# Altium footprint library LDCN Components.PcbLib: 426 footprints (part 22 of 27)
Each footprint in its own frame and in the unit in brackets; x right, y up, seen from the top. Pads: shape width x height; smd on the part's side, far side on the other; paste and mask are expansions set on the pad; w line width, h text height; cw(c..) or ccw(c..) is an arc to the next point about the centre after c.
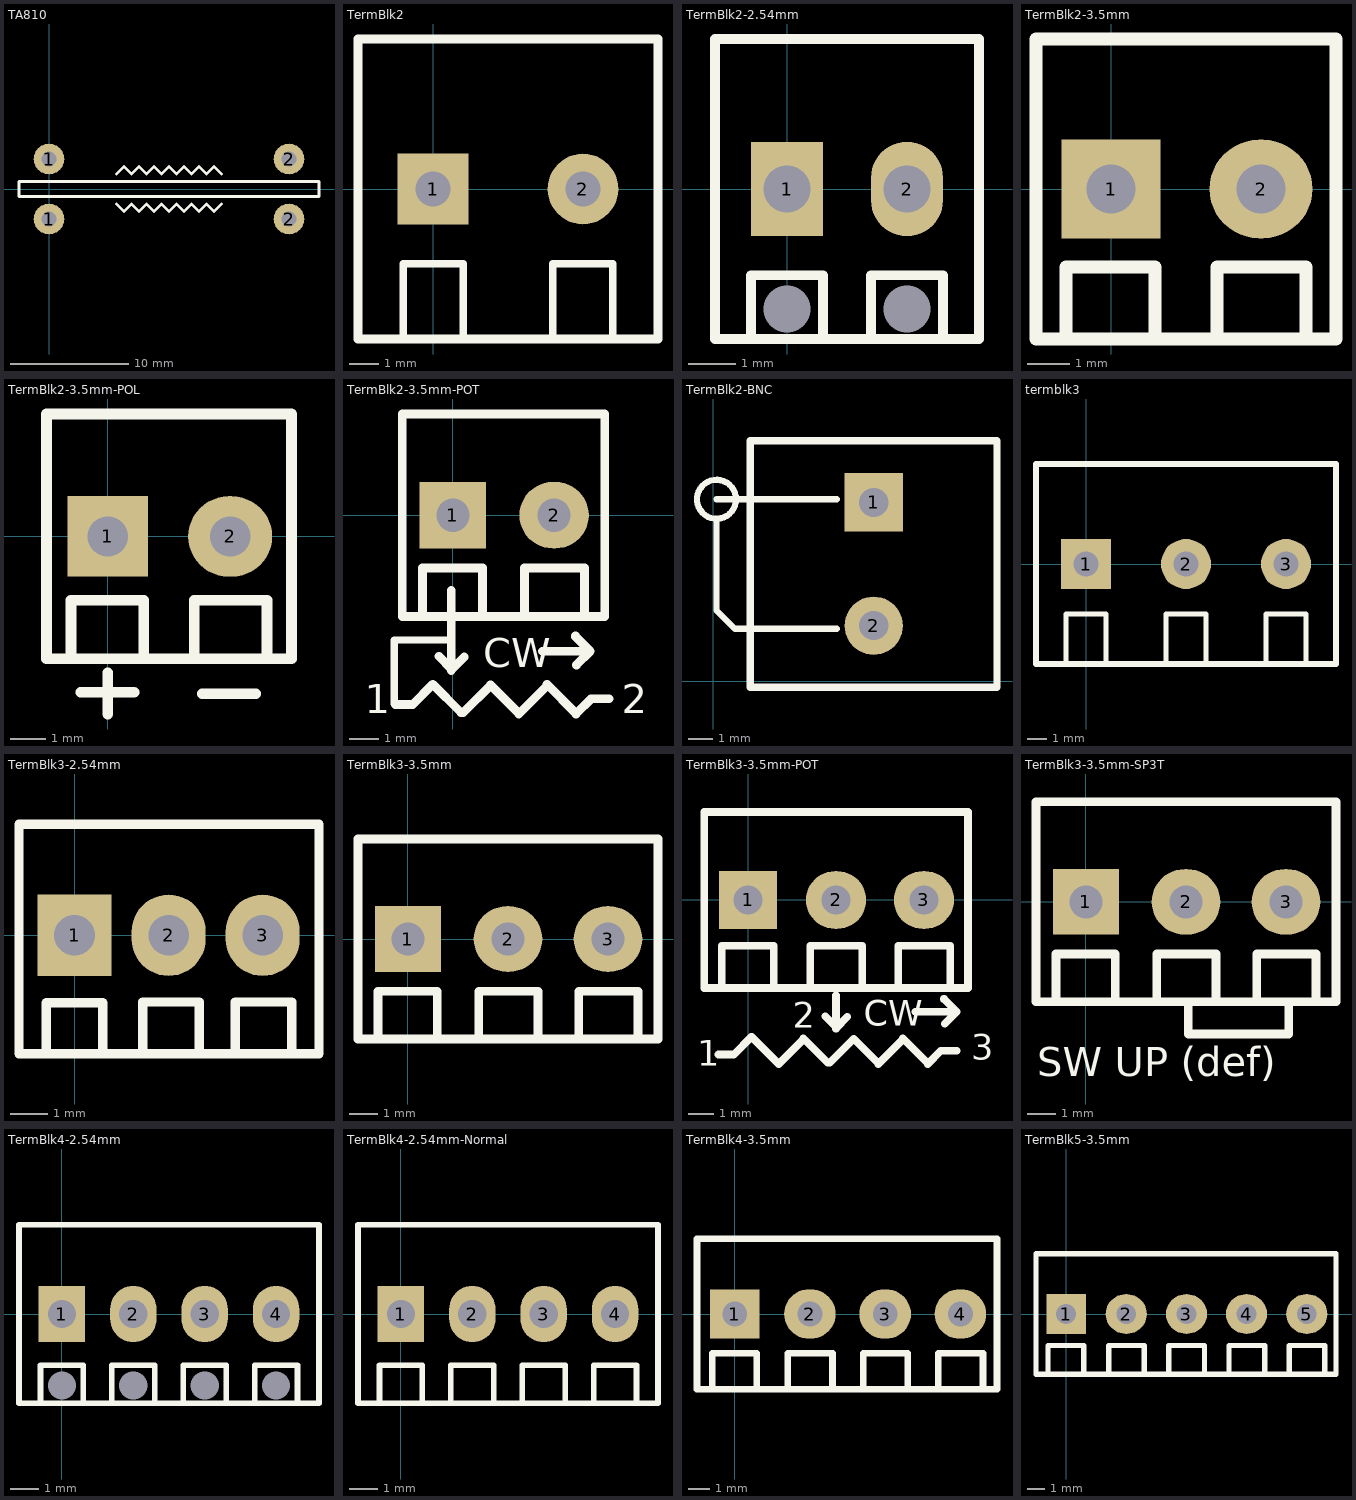
[diagram p21: the footprints below, top view; thin cyan lines are the x and y axes]

## TA810 [mm] "Ohmite TA810 with PW mount"
height 1
pads (4):
  round 2.6 hole 1.3: 1(0,-2.54) 1(0,2.54) 2(20.32,-2.54) 2(20.32,2.54)
Top Overlay:
  lines w0.254: 5.715,-1.27 6.35,-1.905 6.985,-1.27 7.62,-1.905 8.255,-1.27 8.89,-1.905 9.525,-1.27 10.16,-1.905 10.795,-1.27 11.43,-1.905 12.065,-1.27 12.7,-1.905 13.335,-1.27 13.97,-1.905 14.605,-1.27 ; 5.715,1.27 6.35,1.905 6.985,1.27 7.62,1.905 8.255,1.27 8.89,1.905 9.525,1.27 10.16,1.905 10.795,1.27 11.43,1.905 12.065,1.27 12.7,1.905 13.335,1.27 13.97,1.905 14.605,1.27 ; -2.54,-0.635 -2.54,0.635 22.86,0.635 22.86,-0.635 -2.54,-0.635

## TermBlk2 [mm]
pads (2):
  rect 2.4x2.4 hole 1.2: 1(0,0)
  round 2.4 hole 1.2: 2(5.08,0)
Top Overlay:
  lines w0.254: -1.016,-5.08 -1.016,-2.54 1.016,-2.54 1.016,-5.08 ; 4.064,-5.08 4.064,-2.54 6.096,-2.54 6.096,-5.08
  lines w0.305: -2.54,-5.08 -2.54,5.08 7.62,5.08 7.62,-5.08 -2.54,-5.08

## TermBlk2-2.54mm [mm]
height 8
pads (4):
  rect 0x0 hole 1 unplated: 0(0,-2.54) 0(2.54,-2.54)
  rect 1.524x2 hole 1: 1(0,0)
  oval 1.524x2 hole 1: 2(2.54,0)
Top Overlay:
  lines w0.203: -0.762,-3.175 -0.762,-1.825 0.762,-1.825 0.762,-3.175 ; 1.778,-3.175 1.778,-1.825 3.302,-1.825 3.302,-3.175 ; -1.524,-3.175 4.064,-3.175 4.064,3.175 -1.524,3.175 -1.524,-3.175

## TermBlk2-3.5mm [mm]
pads (2):
  rect 2.3x2.3 hole 1.15: 1(0,0)
  oval 2.4x2.3 hole 1.15: 2(3.5,0)
Top Overlay:
  lines w0.305: -1.05,-3.5 -1.05,-1.825 1.025,-1.825 1.025,-3.5 ; 2.475,-3.5 2.475,-1.825 4.55,-1.825 4.55,-3.5 ; -1.75,-3.5 -1.75,3.5 5.25,3.5 5.25,-3.5 -1.75,-3.5

## TermBlk2-3.5mm-POL [mm]
pads (2):
  rect 2.3x2.3 hole 1.15: 1(0,0)
  oval 2.4x2.3 hole 1.15: 2(3.5,0)
Top Overlay:
  lines w0.305: -1.05,-3.5 -1.05,-1.825 1.025,-1.825 1.025,-3.5 ; -0.775,-4.45 0.75,-4.45 ; 0,-5.075 0,-3.9 ; 2.475,-3.5 2.475,-1.825 4.55,-1.825 4.55,-3.5 ; 2.7,-4.5 4.225,-4.5 ; -1.75,-3.5 5.25,-3.5 5.25,3.5 -1.75,3.5 -1.75,-3.5

## TermBlk2-3.5mm-POT [mm]
height 0.025
pads (2):
  rect 2.3x2.3 hole 1.15: 1(0,0)
  oval 2.4x2.3 hole 1.15: 2(3.5,0)
Top Overlay:
  lines w0.254: -1.997,-6.55 -2.032,-6.515 -2.032,-4.318 -0.056,-4.318
  lines w0.305: -1.997,-6.55 -1.397,-6.55 -0.697,-5.85 ; -1.05,-3.5 -1.05,-1.825 1.025,-1.825 1.025,-3.5 ; -0.697,-5.9 -0.697,-5.85 ; -0.481,-4.879 -0.056,-5.304 -0.056,-5.379 ; -0.056,-2.596 -0.056,-5.379 ; 0.394,-4.904 -0.056,-5.354 -0.056,-5.379 ; 2.475,-3.5 2.475,-1.825 4.55,-1.825 4.55,-3.5 ; 3.094,-4.704 4.744,-4.704 ; 4.244,-4.179 4.244,-4.204 4.744,-4.704 ; 4.269,-5.179 4.744,-4.704 ; 5.403,-6.35 4.778,-6.35 4.253,-6.875 4.253,-6.85 3.253,-5.85 3.253,-5.9 2.278,-6.875 2.278,-6.85 1.303,-5.875 0.353,-6.825 0.278,-6.825 -0.697,-5.85 ; 4.744,-4.704 4.744,-4.704 ; -1.75,-3.5 5.25,-3.5 5.25,3.5 -1.75,3.5 -1.75,-3.5
  text "CW" at 1.044,-5.254 h1.02
  text "1" at -3.048,-6.858 h1.02
  text "2" at 5.842,-6.858 h1.02

## TermBlk2-BNC [mm]
pads (2):
  rect 2.4x2.4 hole 1.2: 1(6.604,7.366)
  round 2.4 hole 1.2: 2(6.604,2.286)
Top Overlay:
  circle w0.254: c0.127,7.493 r0.803
  lines w0.254: 0.127,6.604 0.127,2.921 0.889,2.159 5.08,2.159 ; 0.127,7.493 5.08,7.493
  lines w0.305: 1.524,-0.254 1.524,9.906 11.684,9.906 11.684,-0.254 1.524,-0.254

## termblk3 [mm]
pads (3):
  rect 2.54x2.54 hole 1.27: 1(0,0)
  round 2.54 hole 1.27: 2(5.08,0) 3(10.16,0)
Top Overlay:
  lines w0.254: -1.016,-5.08 -1.016,-2.54 1.016,-2.54 1.016,-5.08 ; 4.064,-5.08 4.064,-2.54 6.096,-2.54 6.096,-5.08 ; 9.144,-5.08 9.144,-2.54 11.176,-2.54 11.176,-5.08
  lines w0.305: -2.54,-5.08 12.7,-5.08 12.7,5.08 -2.54,5.08 -2.54,-5.08

## TermBlk3-2.54mm [mm]
pads (3):
  rect 2x2.2 hole 1.1: 1(0,0)
  oval 2x2.2 hole 1.1: 2(2.54,0) 3(5.08,0)
Top Overlay:
  lines w0.254: -0.762,-3.1 -0.762,-1.825 0.762,-1.825 0.762,-3.1 ; 1.838,-3.075 1.838,-1.8 3.362,-1.8 3.362,-3.075 ; 4.338,-3.075 4.338,-1.8 5.862,-1.8 5.862,-3.075 ; -1.5,-3.2 -1.5,3 6.6,3 6.6,-3.2 -1.5,-3.2

## TermBlk3-3.5mm [mm]
pads (3):
  rect 2.3x2.3 hole 1.15: 1(0,0)
  oval 2.4x2.3 hole 1.15: 2(3.5,0) 3(7,0)
Top Overlay:
  lines w0.305: -1.05,-3.5 -1.05,-1.825 1.025,-1.825 1.025,-3.5 ; 2.475,-3.5 2.475,-1.825 4.55,-1.825 4.55,-3.5 ; 5.975,-3.5 5.975,-1.825 8.05,-1.825 8.05,-3.5 ; -1.75,-3.5 8.75,-3.5 8.75,3.5 -1.75,3.5 -1.75,-3.5

## TermBlk3-3.5mm-POT [mm]
pads (3):
  rect 2.3x2.3 hole 1.15: 1(0,0)
  oval 2.4x2.3 hole 1.15: 2(3.5,0) 3(7,0)
Top Overlay:
  lines w0.305: -1.174,-6.151 -0.574,-6.151 0.126,-5.451 0.151,-5.451 1.226,-6.526 2.201,-5.551 2.201,-5.501 3.176,-6.476 3.251,-6.476 4.201,-5.526 5.176,-6.501 5.176,-6.526 6.151,-5.551 6.151,-5.501 7.151,-6.501 7.151,-6.526 7.676,-6.001 8.301,-6.001 ; -1.05,-3.5 -1.05,-1.825 1.025,-1.825 1.025,-3.5 ; 2.475,-3.5 2.475,-1.825 4.55,-1.825 4.55,-3.5 ; 3.075,-4.625 3.5,-5.05 3.5,-5.125 ; 3.5,-3.8 3.5,-5.125 ; 3.95,-4.65 3.5,-5.1 3.5,-5.125 ; 5.975,-3.5 5.975,-1.825 8.05,-1.825 8.05,-3.5 ; 6.65,-4.45 8.3,-4.45 ; 7.8,-3.925 7.8,-3.95 8.3,-4.45 ; 7.825,-4.925 8.3,-4.45 ; 8.3,-4.45 8.3,-4.45 ; -1.75,-3.5 8.75,-3.5 8.75,3.5 -1.75,3.5 -1.75,-3.5
  text "2" at 1.778,-5.08 h1.02
  text "3" at 8.89,-6.35 h1.02
  text "1" at -2.032,-6.604 h1.02
  text "CW" at 4.6,-5 h1.02

## TermBlk3-3.5mm-SP3T [mm]
pads (3):
  rect 2.3x2.3 hole 1.15: 1(0,0)
  oval 2.4x2.3 hole 1.15: 2(3.5,0) 3(7,0)
Top Overlay:
  lines w0.305: -1.05,-3.5 -1.05,-1.825 1.025,-1.825 1.025,-3.5 ; 2.475,-3.5 2.475,-1.825 4.55,-1.825 4.55,-3.5 ; 3.575,-3.5 3.575,-4.625 6.875,-4.625 7.1,-4.625 7.1,-3.5 ; 5.975,-3.5 5.975,-1.825 8.05,-1.825 8.05,-3.5 ; -1.75,-3.5 -1.75,3.5 8.75,3.5 8.75,-3.5 -1.75,-3.5
  text "SW UP (def)" at -1.7,-6.1 h1.02

## TermBlk4-2.54mm [mm]
height 8
pads (8):
  rect 0x0 hole 1 unplated: 0(0,-2.54) 0(2.54,-2.54) 0(5.08,-2.54) 0(7.62,-2.54)
  rect 1.651x2 hole 1: 1(0,0)
  oval 1.651x2 hole 1: 2(2.54,0) 3(5.08,0) 4(7.62,0)
Top Overlay:
  lines w0.203: -0.762,-3.175 -0.762,-1.825 0.762,-1.825 0.762,-3.175 ; 1.778,-3.175 1.778,-1.825 3.302,-1.825 3.302,-3.175 ; 4.318,-3.175 4.318,-1.825 5.842,-1.825 5.842,-3.175 ; 6.858,-3.175 6.858,-1.825 8.382,-1.825 8.382,-3.175 ; -1.524,-3.175 9.144,-3.175 9.144,3.175 -1.524,3.175 -1.524,-3.175

## TermBlk4-2.54mm-Normal [mm]
height 8
pads (4):
  rect 1.651x2 hole 1: 1(0,0)
  oval 1.651x2 hole 1: 2(2.54,0) 3(5.08,0) 4(7.62,0)
Top Overlay:
  lines w0.203: -0.762,-3.175 -0.762,-1.825 0.762,-1.825 0.762,-3.175 ; 1.778,-3.175 1.778,-1.825 3.302,-1.825 3.302,-3.175 ; 4.318,-3.175 4.318,-1.825 5.842,-1.825 5.842,-3.175 ; 6.858,-3.175 6.858,-1.825 8.382,-1.825 8.382,-3.175 ; -1.524,-3.175 9.144,-3.175 9.144,3.175 -1.524,3.175 -1.524,-3.175

## TermBlk4-3.5mm [mm]
pads (4):
  rect 2.3x2.3 hole 1.15: 1(0,0)
  oval 2.4x2.3 hole 1.15: 2(3.5,0) 3(7,0) 4(10.5,0)
Top Overlay:
  lines w0.305: -1.05,-3.5 -1.05,-1.825 1.025,-1.825 1.025,-3.5 ; 2.475,-3.5 2.475,-1.825 4.55,-1.825 4.55,-3.5 ; 5.975,-3.5 5.975,-1.825 8.05,-1.825 8.05,-3.5 ; 9.475,-3.5 9.475,-1.825 11.55,-1.825 11.55,-3.5 ; -1.75,-3.5 -1.75,3.5 12.2,3.5 12.2,-3.5 -1.75,-3.5

## TermBlk5-3.5mm [mm]
pads (5):
  rect 2.3x2.3 hole 1.15: 1(0,0)
  oval 2.4x2.3 hole 1.15: 2(3.5,0) 3(7,0) 4(10.5,0) 5(14,0)
Top Overlay:
  lines w0.305: -1.05,-3.5 -1.05,-1.825 1.025,-1.825 1.025,-3.5 ; 2.475,-3.5 2.475,-1.825 4.55,-1.825 4.55,-3.5 ; 5.975,-3.5 5.975,-1.825 8.05,-1.825 8.05,-3.5 ; 9.475,-3.5 9.475,-1.825 11.55,-1.825 11.55,-3.5 ; 12.975,-3.5 12.975,-1.825 15.05,-1.825 15.05,-3.5 ; -1.75,-3.5 -1.75,3.5 15.7,3.5 15.7,-3.5 -1.75,-3.5